# Altium footprint library 9-Pcblib_Con.PcbLib: 266 footprints (part 5 of 17)
Each footprint in its own frame and in the unit in brackets; x right, y up, seen from the top. Pads: shape width x height; smd on the part's side, far side on the other; paste and mask are expansions set on the pad; w line width, h text height; cw(c..) or ccw(c..) is an arc to the next point about the centre after c.
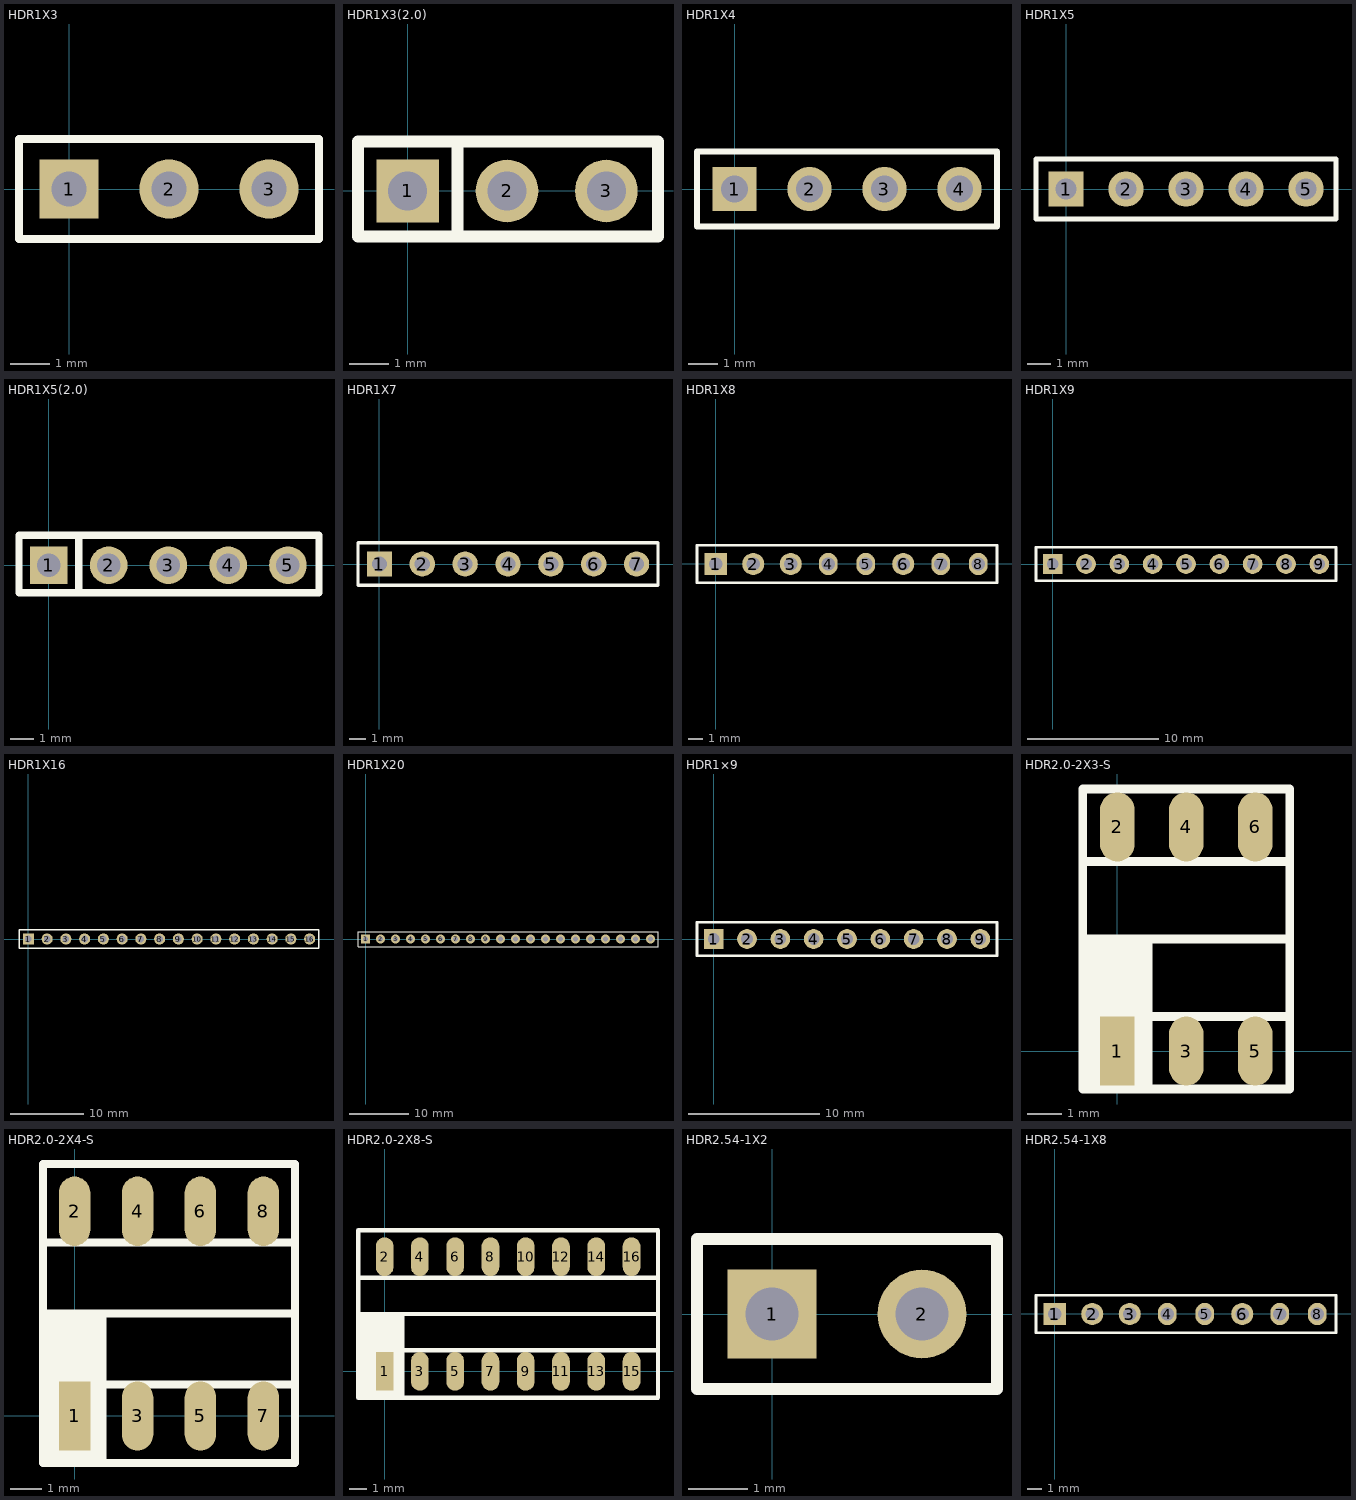
[diagram p4: the footprints below, top view; thin cyan lines are the x and y axes]

## HDR1X3 [mm] "Connector; Header; 3 Position"
pads (3):
  rect 1.5x1.5 hole 0.9: 1(0,0)
  round 1.5 hole 0.9: 2(2.54,0) 3(5.08,0)
Top Overlay:
  lines w0.2: -1.27,-1.27 6.35,-1.27 6.35,1.27 -1.27,1.27 -1.27,-1.27
3D body: height 8.54, standoff -3, extent -1.27,-1.27 6.35,1.27

## HDR1X3(2.0) [mm]
pads (3):
  rect 1.6x1.6 hole 1: 1(0,0)
  round 1.6 hole 1: 2(2.54,0) 3(5.08,0)
Top Overlay:
  lines w0.305: 1.27,-1.168 1.27,1.27 ; 6.401,-1.168 6.401,1.27 ; -1.27,-1.168 6.35,-1.168 -1.27,-1.168 ; -1.27,-1.168 -1.27,1.27 ; -1.27,1.27 6.325,1.27 -1.27,1.27

## HDR1X4 [mm] "Connector; Header; 4 Position"
height 5.08
pads (4):
  rect 1.5x1.5 hole 0.9: 1(0,0)
  round 1.5 hole 0.9: 2(2.54,0) 3(5.08,0) 4(7.62,0)
Top Overlay:
  lines w0.2: -1.27,-1.27 8.89,-1.27 8.89,1.27 -1.27,1.27 -1.27,-1.27
3D body: height 8.54, standoff -3, extent -1.27,-1.27 8.89,1.27

## HDR1X5 [mm] "Connector; Header; 5 Position"
height 0.508
pads (5):
  rect 1.5x1.5 hole 0.9: 1(0,0)
  round 1.5 hole 0.9: 2(2.54,0) 3(5.08,0) 4(7.62,0) 5(10.16,0)
Top Overlay:
  lines w0.2: -1.27,-1.27 11.43,-1.27 11.43,1.27 -1.27,1.27 -1.27,-1.27
3D body: height 8.54, standoff -3, extent -1.27,-1.27 11.43,1.27

## HDR1X5(2.0) [mm]
pads (5):
  rect 1.6x1.6 hole 1: 1(0,0)
  round 1.6 hole 1: 2(2.54,0) 3(5.08,0) 4(7.62,0) 5(10.16,0)
Top Overlay:
  lines w0.305: 1.27,-1.168 1.27,1.27 ; -1.27,-1.168 -1.27,1.27 11.481,1.27 11.481,-1.168 -1.27,-1.168

## HDR1X7 [mm] "Connector; Header; 7 Position"
height 0.254
pads (7):
  rect 1.5x1.5 hole 0.9: 1(0,0)
  round 1.5 hole 0.9: 2(2.54,0) 3(5.08,0) 4(7.62,0) 5(10.16,0) 6(12.7,0) 7(15.24,0)
Top Overlay:
  lines w0.2: -1.27,-1.27 -1.27,1.27 16.51,1.27 16.51,-1.27 -1.27,-1.27
3D body: height 8.54, standoff -3, extent -1.27,-1.27 16.51,1.27

## HDR1X8 [mm] "Connector; Header; 8 Position"
pads (8):
  rect 1.5x1.5 hole 0.9: 1(0,0)
  round 1.5 hole 0.9: 2(2.54,0) 3(5.08,0) 6(12.7,0)
  oval 1.27x1.5 hole 0.9: 4(7.62,0) 5(10.16,0) 7(15.24,0) 8(17.78,0)
Top Overlay:
  lines w0.2: -1.27,-1.27 -1.27,1.27 19.05,1.27 19.05,-1.27 -1.27,-1.27
3D body: height 0.7, standoff -10.9, extent -1.27,-1.27 19.05,1.27

## HDR1X9 [mm] "Connector; Header; 9 Position"
pads (9):
  rect 1.5x1.5 hole 0.9: 1(0,0)
  round 1.5 hole 0.9: 2(2.54,0) 3(5.08,0) 4(7.62,0) 5(10.16,0) 6(12.7,0) 7(15.24,0) 8(17.78,0) 9(20.32,0)
Top Overlay:
  lines w0.2: -1.27,-1.27 -1.27,1.27 21.59,1.27 21.59,-1.27 -1.27,-1.27
3D body: height 4.57, standoff -2.92, extent -1.27,-1.27 21.59,1.27

## HDR1X16 [mm] "Connector; Header; 16 Position"
pads (16):
  rect 1.5x1.5 hole 0.9: 1(0,0)
  round 1.5 hole 0.9: 2(2.54,0) 3(5.08,0) 4(7.62,0) 5(10.16,0) 6(12.7,0) 7(15.24,0) 8(17.78,0) 9(20.32,0) 10(22.86,0) 11(25.4,0) 12(27.94,0) 13(30.48,0) 14(33.02,0) 15(35.56,0) 16(38.1,0)
Top Overlay:
  lines w0.2: -1.27,-1.27 39.37,-1.27 39.37,1.27 0.635,1.27 -1.27,1.27 -1.27,-1.27

## HDR1X20 [mm] "Connector; Header; 20 Position"
pads (20):
  rect 1.5x1.5 hole 0.9: 1(0,0)
  round 1.5 hole 0.9: 2(2.54,0) 3(5.08,0) 4(7.62,0) 5(10.16,0) 6(12.7,0) 7(15.24,0) 8(17.78,0) 9(20.32,0) 10(22.86,0) 11(25.4,0) 12(27.94,0) 13(30.48,0) 14(33.02,0) 15(35.56,0) 16(38.1,0) 17(40.64,0) 18(43.18,0) 19(45.72,0) 20(48.26,0)
Top Overlay:
  lines w0.2: -1.27,-1.27 49.53,-1.27 49.53,1.27 0.635,1.27 -1.27,1.27 -1.27,-1.27

## HDR1×9 [mm]
height 4
pads (9):
  rect 1.5x1.5 hole 0.9: 1(0,0)
  round 1.5 hole 0.9: 2(2.54,0) 3(5.08,0) 4(7.62,0) 5(10.16,0) 6(12.7,0) 7(15.24,0) 8(17.78,0) 9(20.32,0)
Top Overlay:
  lines w0.2: -1.27,-1.27 -1.27,1.27 21.59,1.27 21.59,-1.27 -1.27,-1.27
3D body: height 4.57, standoff -2.92, extent -1.219,-1.244 21.641,1.296

## HDR2.0-2X3-S [mm]
pads (6):
  rect 1x2 smd: 1(0,0)
  oval 1x2 smd: 2(0,6.5) 3(2,0) 4(2,6.5) 5(4,0) 6(4,6.5)
Top Overlay:
  rectangle: -1.016,-1.067 1.016,3.251
  lines w0.254: -1,1 5,1 ; -1,3.25 5,3.25 ; -1,5.5 5,5.5 ; -1,-1.1 5,-1.1 5,7.6 -1,7.6 -1,-1.1
3D body: height 2.29, standoff 0.14, extent -1.044,0.225 4.956,6.325

## HDR2.0-2X4-S [mm]
pads (8):
  rect 1x2.2 smd: 1(0,0)
  oval 1x2.2 smd: 2(0,6.5) 3(2,0) 4(2,6.5) 5(4,0) 6(4,6.5) 7(6,0) 8(6,6.5)
Top Overlay:
  rectangle: -1.016,-1.524 1.016,3.251
  lines w0.254: -1,1 7,1 ; -1,3.25 7,3.25 ; -1,5.5 7,5.5 ; -1,-1.5 -1,8 7,8 7,-1.5 -1,-1.5

## HDR2.0-2X8-S [mm]
pads (16):
  rect 1x2.2 smd: 1(0,0)
  oval 1x2.2 smd: 2(0,6.5) 3(2,0) 4(2,6.5) 5(4,0) 6(4,6.5) 7(6,0) 8(6,6.5) 9(8,0) 10(8,6.5) 11(10,0) 12(10,6.5) 13(12,0) 14(12,6.5) 15(14,0) 16(14,6.5)
Top Overlay:
  rectangle: -1.509,-1.5 1.133,3.25
  lines w0.254: -1.5,1.2 15.5,1.2 ; -1.5,3.25 15.5,3.25 ; -1.5,5.3 15.5,5.3 ; -1.5,-1.5 -1.5,8 15.5,8 15.5,-1.5 -1.5,-1.5

## HDR2.54-1X2 [mm] "两针跳线（已加焊）"
pads (2):
  rect 1.5x1.5 hole 0.9: 1(0,0)
  round 1.5 hole 0.9: 2(2.54,0)
Top Overlay:
  lines w0.2: -1.27,-1.27 3.81,-1.27 3.81,1.27 -1.27,1.27 -1.27,-1.27
3D body: height 8.68, standoff -3, extent -1.27,-1.265 3.81,1.275

## HDR2.54-1X8 [mm] "Connector; Header; 8 Position"
pads (8):
  rect 1.5x1.5 hole 0.9: 1(0,0)
  round 1.5 hole 0.9: 2(2.54,0) 3(5.08,0) 6(12.7,0)
  oval 1.27x1.5 hole 0.9: 4(7.62,0) 5(10.16,0) 7(15.24,0) 8(17.78,0)
Top Overlay:
  lines w0.2: -1.27,-1.27 19.05,-1.27 19.05,1.27 -1.27,1.27 -1.27,-1.27
3D body: height 0.7, standoff -10.9, extent -1.27,-1.27 19.05,1.27